# Altium footprint library XU-GENARAL PCB .PcbLib: 1176 footprints (part 30 of 75)
Each footprint in its own frame and in the unit in brackets; x right, y up, seen from the top. Pads: shape width x height; smd on the part's side, far side on the other; paste and mask are expansions set on the pad; w line width, h text height; cw(c..) or ccw(c..) is an arc to the next point about the centre after c.
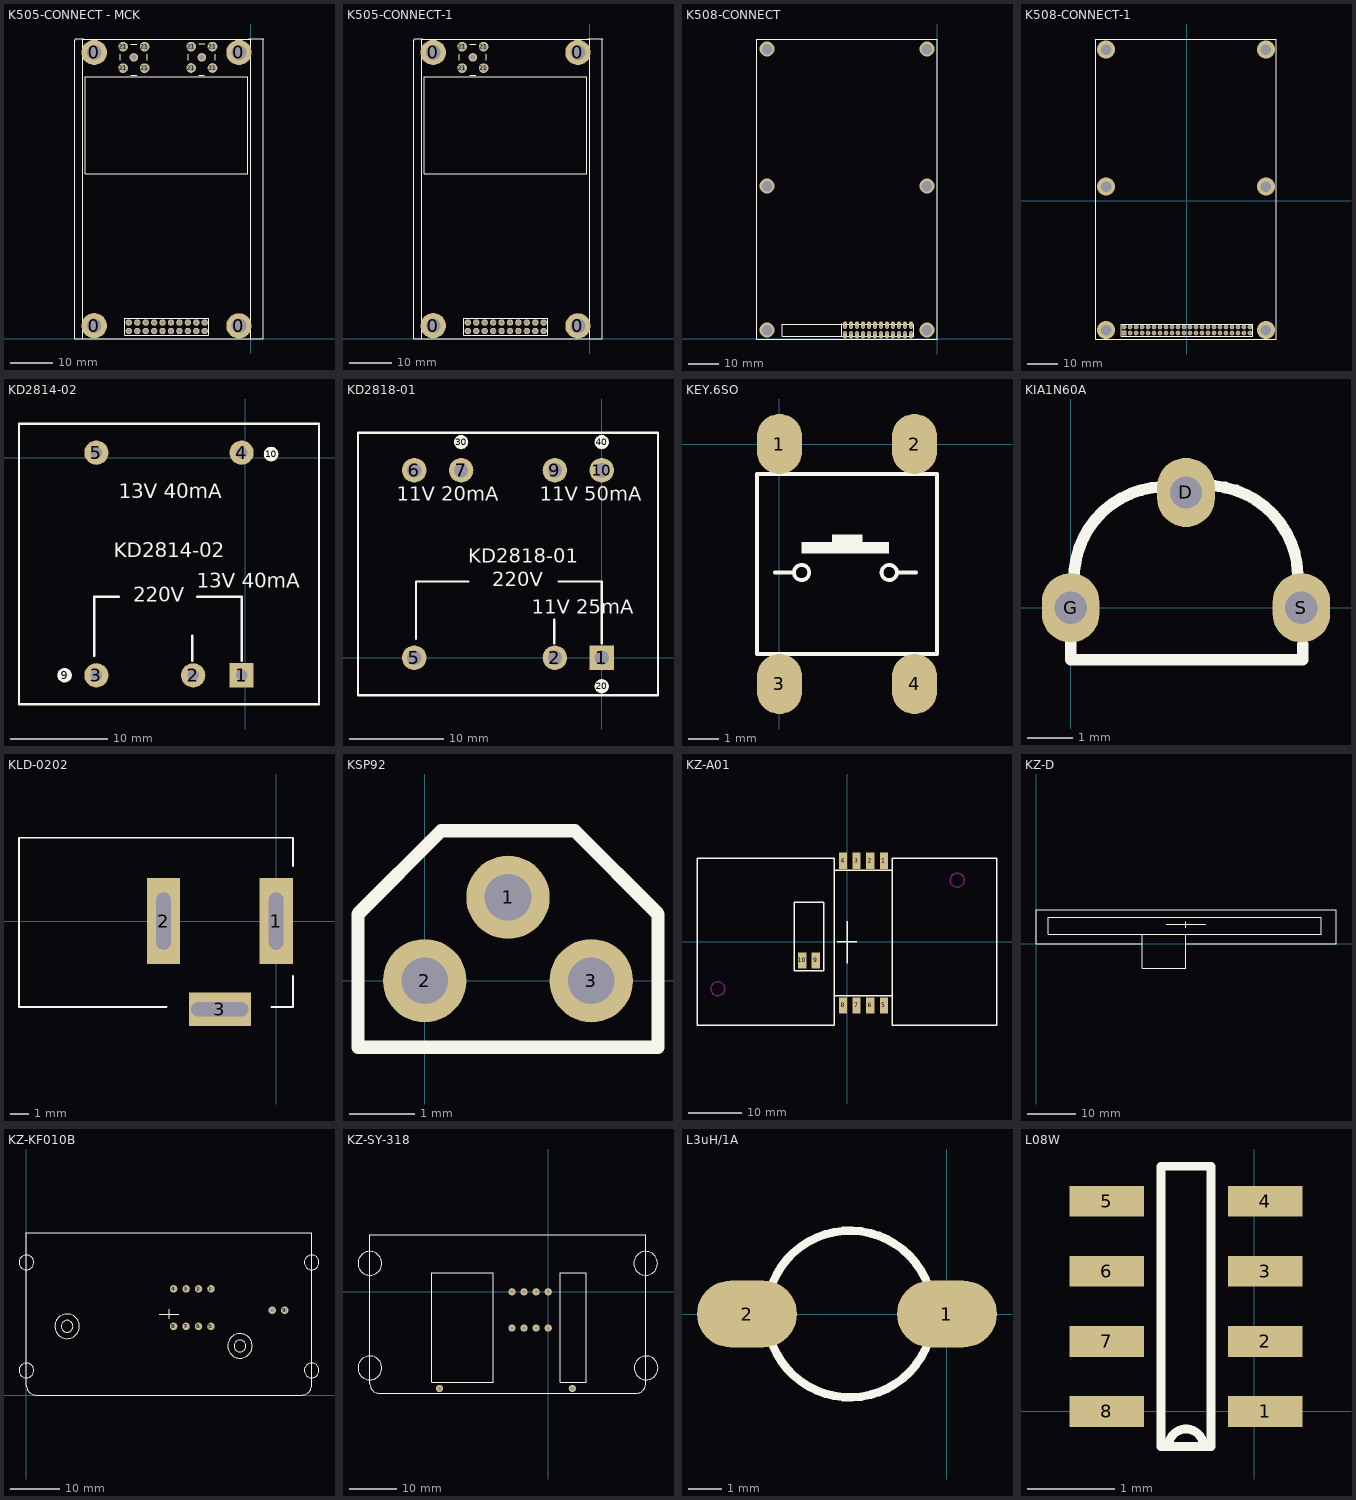
[diagram p29: the footprints below, top view; thin cyan lines are the x and y axes]

## K505-CONNECT - MCK [mil]
pads (34):
  round 236.22 hole 137.8: 0(-1461.2,124.02) 0(-1461.2,2674.18) 0(-110.8,123) 0(-110.8,2674.18)
  round 60 hole 40: 1(-429.9,74.8) 2(-429.9,153.54) 3(-508.64,74.8) 4(-508.64,153.54) 5(-587.38,74.8) 6(-587.38,153.54) 7(-666.12,74.8) 8(-666.12,153.54) 9(-744.86,74.8) 10(-744.86,153.54) 11(-823.6,74.8) 12(-823.6,153.54) 13(-902.34,74.8) 14(-902.34,153.54) 15(-981.08,74.8) 16(-981.08,153.54) 17(-1059.82,74.8) 18(-1059.82,153.54) 19(-1138.56,74.8) 20(-1138.56,153.54)
  round 90 hole 60: 21(-1191.12,2528.22) 21(-1191.12,2728.22) 21(-991.12,2528.22) 21(-991.12,2728.22) 21(-557.26,2529.18) 21(-557.26,2729.18) 21(-357.26,2529.18) 21(-357.26,2729.18)
  round 80 hole 50: 22(-1091.12,2628.22) 22(-457.26,2629.18)
Top Overlay:
  lines w8: -1216.12,2600.67 -1216.12,2655.78 ; -1121.68,2460.22 -1066.56,2460.22 ; -1118.68,2753.22 -1063.56,2753.22 ; -966.12,2600.67 -966.12,2655.78 ; -582.26,2601.62 -582.26,2656.74 ; -487.82,2461.18 -432.7,2461.18 ; -484.82,2754.18 -429.7,2754.18 ; -332.26,2601.62 -332.26,2656.74
  lines w10: -1560,2800 -1635,2800 -1645,2790 -1645,0 -1451.89,0 ; -399.3,36.54 -1176.3,36.54 -1176.3,190.54 -1174.3,192.54 -396.3,192.54 ; -392.3,36.54 -392.3,193.54 ; -110.8,0 -110.8,124.02 ; -20,2800 115,2800 118.11,2796.89 118.11,0 0,0 ; -1570,0 1.4,0 1.4,2799.21 -1570,2799.21 -1570,0 ; -1542.94,1540.55 -27.19,1540.55 -27.19,2446.06 -1542.94,2446.06 -1542.94,1540.55

## K505-CONNECT-1 [mil]
pads (29):
  round 236.22 hole 137.8: 0(-1461.2,124.02) 0(-1461.2,2674.18) 0(-110.8,123) 0(-110.8,2674.18)
  round 60 hole 40: 1(-429.9,74.8) 2(-429.9,153.54) 3(-508.64,74.8) 4(-508.64,153.54) 5(-587.38,74.8) 6(-587.38,153.54) 7(-666.12,74.8) 8(-666.12,153.54) 9(-744.86,74.8) 10(-744.86,153.54) 11(-823.6,74.8) 12(-823.6,153.54) 13(-902.34,74.8) 14(-902.34,153.54) 15(-981.08,74.8) 16(-981.08,153.54) 17(-1059.82,74.8) 18(-1059.82,153.54) 19(-1138.56,74.8) 20(-1138.56,153.54)
  round 90 hole 60: 21(-1191.12,2528.22) 21(-1191.12,2728.22) 21(-991.12,2528.22) 21(-991.12,2728.22)
  round 80 hole 50: 22(-1091.12,2628.22)
Top Overlay:
  lines w8: -1216.12,2600.67 -1216.12,2655.78 ; -1121.68,2460.22 -1066.56,2460.22 ; -1118.68,2753.22 -1063.56,2753.22 ; -966.12,2600.67 -966.12,2655.78
  lines w10: -1560,2800 -1635,2800 -1645,2790 -1645,0 -1451.89,0 ; -399.3,36.54 -1176.3,36.54 -1176.3,190.54 -1174.3,192.54 -396.3,192.54 ; -392.3,36.54 -392.3,193.54 ; -110.8,0 -110.8,124.02 ; -20,2800 115,2800 118.11,2796.89 118.11,0 0,0 ; -1570,0 1.4,0 1.4,2799.21 -1570,2799.21 -1570,0 ; -1542.94,1540.55 -27.19,1540.55 -27.19,2446.06 -1542.94,2446.06 -1542.94,1540.55

## K508-CONNECT [mm]
pads (24):
  oval 1.27x2.54 hole 1.016 copper offset 0,-0.635: 1(-8.7,2) 3(-10.7,2) 5(-12.7,2) 7(-14.7,2) 9(-16.7,2) 11(-18.7,2) 13(-20.7,2) 15(-22.7,2) 17(-24.7,2) 19(-26.7,2) 21(-28.7,2) 23(-30.7,2)
  oval 1.27x2.54 hole 1.016 copper offset 0,0.635: 2(-8.7,4) 4(-10.7,4) 6(-12.7,4) 8(-14.7,4) 10(-16.7,4) 12(-18.7,4) 14(-20.7,4) 16(-22.7,4) 18(-24.7,4) 20(-26.7,4) 22(-28.7,4) 24(-30.7,4)
via -56.7,3 diameter 5 hole 3.5
via -56.7,96.7 diameter 5 hole 3.5
via -56.7,51 diameter 5 hole 3.5
via -3.4,96.7 diameter 5 hole 3.5
via -3.4,51 diameter 5 hole 3.5
via -3.4,3 diameter 5 hole 3.5
Top Overlay:
  lines w0.254: -31.81,1.12 -31.81,5.01 ; -60.071,0 -60.071,100.076 0,100.076 0,0 -60.071,0 ; -51.7,1 -7.72,1 -7.72,5 -51.7,5 -51.7,1

## K508-CONNECT-1 [mil]
pads (44):
  rect 60x60 hole 40: 1(-824.72,-1735.98)
  round 60 hole 40: 1(828.82,-1735.98) 2(-824.72,-1657.24) 3(-745.98,-1735.98) 4(-745.98,-1657.24) 5(-667.24,-1735.98) 6(-667.24,-1657.24) 7(-588.5,-1735.98) 8(-588.5,-1657.24) 9(-509.76,-1735.98) 10(-509.76,-1657.24) 11(-431.02,-1735.98) 12(-431.02,-1657.24) 13(-352.28,-1735.98) 14(-352.28,-1657.24) 15(-273.54,-1735.98) 16(-273.54,-1657.24) 17(-194.8,-1735.98) 18(-194.8,-1657.24) 19(-116.06,-1735.98) 20(-116.06,-1657.24) 21(-37.32,-1735.98) 22(-37.32,-1657.24) 23(41.42,-1735.98) 24(41.42,-1657.24) 25(120.16,-1735.98) 26(120.16,-1657.24) 27(198.9,-1735.98) 28(198.9,-1657.24) 29(277.64,-1735.98) 30(277.64,-1657.24) 31(356.38,-1735.98) 32(356.38,-1657.24) 33(435.12,-1735.98) 34(435.12,-1657.24) 35(513.86,-1735.98) 36(513.86,-1657.24) 37(592.6,-1735.98) 38(592.6,-1657.24) 39(671.34,-1735.98) 40(671.34,-1657.24) 41(750.08,-1735.98) 42(750.08,-1657.24) 44(828.82,-1657.24)
via 1037.48,-1696.61 diameter 236.22 hole 137.8
via 1037.48,185.28 diameter 236.22 hole 137.8
via 1037.48,1984.5 diameter 236.22 hole 137.8
via -1060.94,185.28 diameter 236.22 hole 137.8
via -1060.94,1984.5 diameter 236.22 hole 137.8
via -1060.94,-1696.61 diameter 236.22 hole 137.8
Top Overlay:
  lines w10: -1193.66,-1814.72 1171.34,-1814.72 1171.34,2125.28 -1193.66,2125.28 -1193.66,-1814.72 ; -864.09,-1775.35 -864.09,-1617.87 867.4,-1617.87 867.4,-1775.35 -864.09,-1775.35

## KD2814-02 [mm]
pads (7):
  rect 2.5x2.5 hole 1.2: 1(-0.367,-22.467)
  round 2.5 hole 1.2: 2(-5.367,-22.467) 3(-15.367,-22.467) 4(-0.367,0.533) 5(-15.367,0.533)
  round 1.524 on Top Overlay: 9(-18.655,-22.467) 10(2.681,0.393)
Top Overlay:
  lines w0.254: -15.607,-20.435 -15.607,-14.339 -13.067,-14.339 ; -5.447,-20.943 -5.447,-18.403 ; -4.939,-14.339 -0.367,-14.339 -0.367,-20.943 ; -23.367,-25.467 7.633,-25.467 7.633,3.533 -23.367,3.533 -23.367,-25.467
  text "13V 40mA" at -13.067,-4.179 h1.52
  text "KD2814-02" at -13.575,-10.275 h1.52
  text "13V 40mA" at -4.99,-13.424 h1.52
  text "220V" at -11.543,-14.847 h1.52

## KD2818-01 [mm]
pads (10):
  rect 2.6x2.6 hole 1.5: 1(0,0)
  round 2.6 hole 1.5: 2(-5,0) 5(-20,0) 6(-20,20) 7(-15,20) 9(-5,20) 10(0,20)
  round 1.524 on Top Overlay: 20(0,-3.048) 30(-15,23) 40(0,23)
Top Overlay:
  lines w0.254: -19.812,2.032 -19.812,8.128 -14.224,8.128 ; -5.08,1.524 -5.08,4.064 ; -4.572,8.128 0,8.128 0,1.524 ; -26,-4 -26,24 6,24 6,-4 -26,-4
  text "11V 25mA" at -7.468,4.674 h1.52
  text "220V" at -11.684,7.62 h1.52
  text "KD2818-01" at -14.224,10.16 h1.52
  text "11V 50mA" at -6.604,16.764 h1.52
  text "11V 20mA" at -21.844,16.764 h1.52

## KEY.6SO [mm]
pads (4):
  oval 1.5x2 smd: 1(0,0) 2(4.5,0) 3(0,-8) 4(4.5,-8)
Top Overlay:
  circle w0.127: c3.658,-4.285 r0.254
  circle w0.127: c0.737,-4.285 r0.254
  rectangle: 1.753,-3.396 2.769,-3.015
  rectangle: 0.737,-3.65 3.658,-3.269
  lines w0.127: -0.152,-4.285 0.483,-4.285 ; 3.912,-4.285 4.547,-4.285 ; -0.75,-7 5.25,-7 5.25,-1 -0.75,-1 -0.75,-7

## KIA1N60A [mil]
pads (3):
  oval 50x60 hole 28: D(100,100) G(0,0) S(200,0)
Top Overlay:
  lines w10: 0,-29 0,-45 201,-45 201,-32 ; 3,23 cw(c82.5,25.5) 80,105 ; 115,106 cw(c117.5,26.5) 197,29

## KLD-0202 [mil] "DC Power Jack, 2.5mm, KLD Series, PCB Mount"
height 43.31
pads (3):
  rect 70x180 hole 30 slot 120 at 90 deg: 1(0,0) 2(-236.22,0)
  rect 130x70 hole 30 slot 120 at 0 deg: 3(-118.11,-185.04)
Top Overlay:
  lines w3.94: -229.37,-180 -539.37,-180 -539.37,175 35.63,175 35.63,115 ; -9.37,-180 35.63,-180 35.63,-115

## KSP92 [mil]
pads (3):
  round 50 hole 28: 1(50,50) 2(0,0) 3(100,0)
Top Overlay:
  lines w8: -40,-40 140,-40 140,40 90,90 10,90 -40,40 -40,-40

## KZ-A01 [mil]
pads (10):
  rect 60x120 smd: 1(270.47,594.49) 2(170.47,594.49) 3(70.47,594.49) 4(-29.53,594.49) 5(270.47,-468.5) 6(170.47,-468.5) 7(70.47,-468.5) 8(-29.53,-468.5) 9(-229.53,-137.8) 10(-329.53,-137.8)
Top Overlay:
  lines w10: -92.52,-397.64 333.46,-397.64 ; -87.99,523.62 330.31,523.62 ; -70.87,0 72.83,0 ; 0,-156.5 0,149.61 ; -1102.76,-614.17 -92.52,-614.17 -92.52,614.17 -1102.76,614.17 -1102.76,-614.17 ; -388.58,-212.6 -388.58,291.34 -170.47,291.34 -170.47,-212.6 -388.58,-212.6 ; 333.46,-614.17 333.46,614.17 1101.97,614.17 1101.97,-614.17 333.46,-614.17
Keep-Out Layer:
  circle w10: c809.84,452.76 r51.18
  circle w10: c-950,-346.46 r51.18

## KZ-D [mil]
Top Overlay:
  lines w10: 866.14,80 866.14,0 ; 1060,157.48 1380,157.48 ; 1220,131.5 1220,180 ; 1220.47,79.53 1220.47,0 ; 866.14,0 0,0 0,275.59 2440.95,275.59 2440.95,0 1220.47,0 ; 866.14,0 866.14,-196.85 1220.47,-196.85 1220.47,0 ; 100,80 880,80 1220,80 2320,80 2320,216.53 100,216.53 100,80

## KZ-KF010B [mil]
pads (10):
  round 60 hole 30: 1(1480.32,851.18) 2(1380.32,851.18) 3(1280.32,851.18) 4(1180.32,851.18) 5(1480.32,551.18) 6(1380.32,551.18) 7(1280.32,551.18) 8(1180.32,551.18)
  round 60 hole 35: 9(2070.87,679.53) 10(1970.87,679.53)
Top Overlay:
  circle w10: c1712.6,393.7 r98.42
  circle w10: c326.77,551.18 r98.42
  circle w10: c2287.4,1062.99 r59.05
  circle w10: c0,1062.99 r59.05
  circle w10: c2287.4,196.85 r59.05
  circle w10: c0,196.85 r59.05
  circle w10: c1712.6,393.7 r47.24
  circle w10: c326.77,551.18 r47.24
  lines w10: 0,78.74 ccw(c78.74,78.74) 78.74,0 2208.66,0 ccw(c2208.66,78.74) 2287.4,78.74 2287.4,1299.21 3.62,1299.21 ; 0,79.37 0,1299.21 ; 1064.96,649.61 1222.44,649.61 ; 1143.7,610.24 1143.7,688.98

## KZ-SY-318 [mil]
pads (10):
  round 60 hole 30: 1(0,0) 2(-100,0) 3(-200,0) 4(-300,0) 5(0,-300) 6(-100,-300) 7(-200,-300) 8(-300,-300)
  round 60 hole 35: 9(200,-800) 10(-900,-800)
Top Overlay:
  circle w10: c-1476.38,-629.92 r98.42
  circle w10: c811.02,-629.92 r98.42
  circle w10: c-1476.38,236.22 r98.42
  circle w10: c807.09,236.22 r98.42
  lines w10: -1476.38,-760.63 ccw(c-1397.64,-760.63) -1397.64,-839.37 728.35,-839.37 ccw(c728.35,-760.63) 807.09,-760.63 807.09,472.44 -1476.38,472.44 -1476.38,-760.63 ; -964.57,-748.03 -964.57,157.48 -452.76,157.48 -452.76,-748.03 -964.57,-748.03 ; 98.42,-748.03 314.96,-748.03 314.96,157.48 98.42,157.48 98.42,-748.03

## L3uH/1A [mm]
height 6.8
pads (2):
  oval 3x2 smd: 1(0,0) 2(-6,0)
Top Overlay:
  circle w0.254: c-2.913,0 r2.5

## L08W [mm]
pads (8):
  rect 0.854x0.35 smd: 1(0.127,0) 2(0.127,0.8) 3(0.127,1.6) 4(0.127,2.4) 5(-1.681,2.4) 6(-1.681,1.6) 7(-1.681,0.8) 8(-1.681,0)
Top Overlay:
  lines w0.1: -1.062,-0.4 -1.062,2.8 -0.492,2.8 -0.492,-0.4 -0.977,-0.4 cw(c-0.777,-0.4) -0.577,-0.4 -1.062,-0.4